# Altium footprint library Amirreza.PcbLib: 524 footprints (part 15 of 33)
Each footprint in its own frame and in the unit in brackets; x right, y up, seen from the top. Pads: shape width x height; smd on the part's side, far side on the other; paste and mask are expansions set on the pad; w line width, h text height; cw(c..) or ccw(c..) is an arc to the next point about the centre after c.
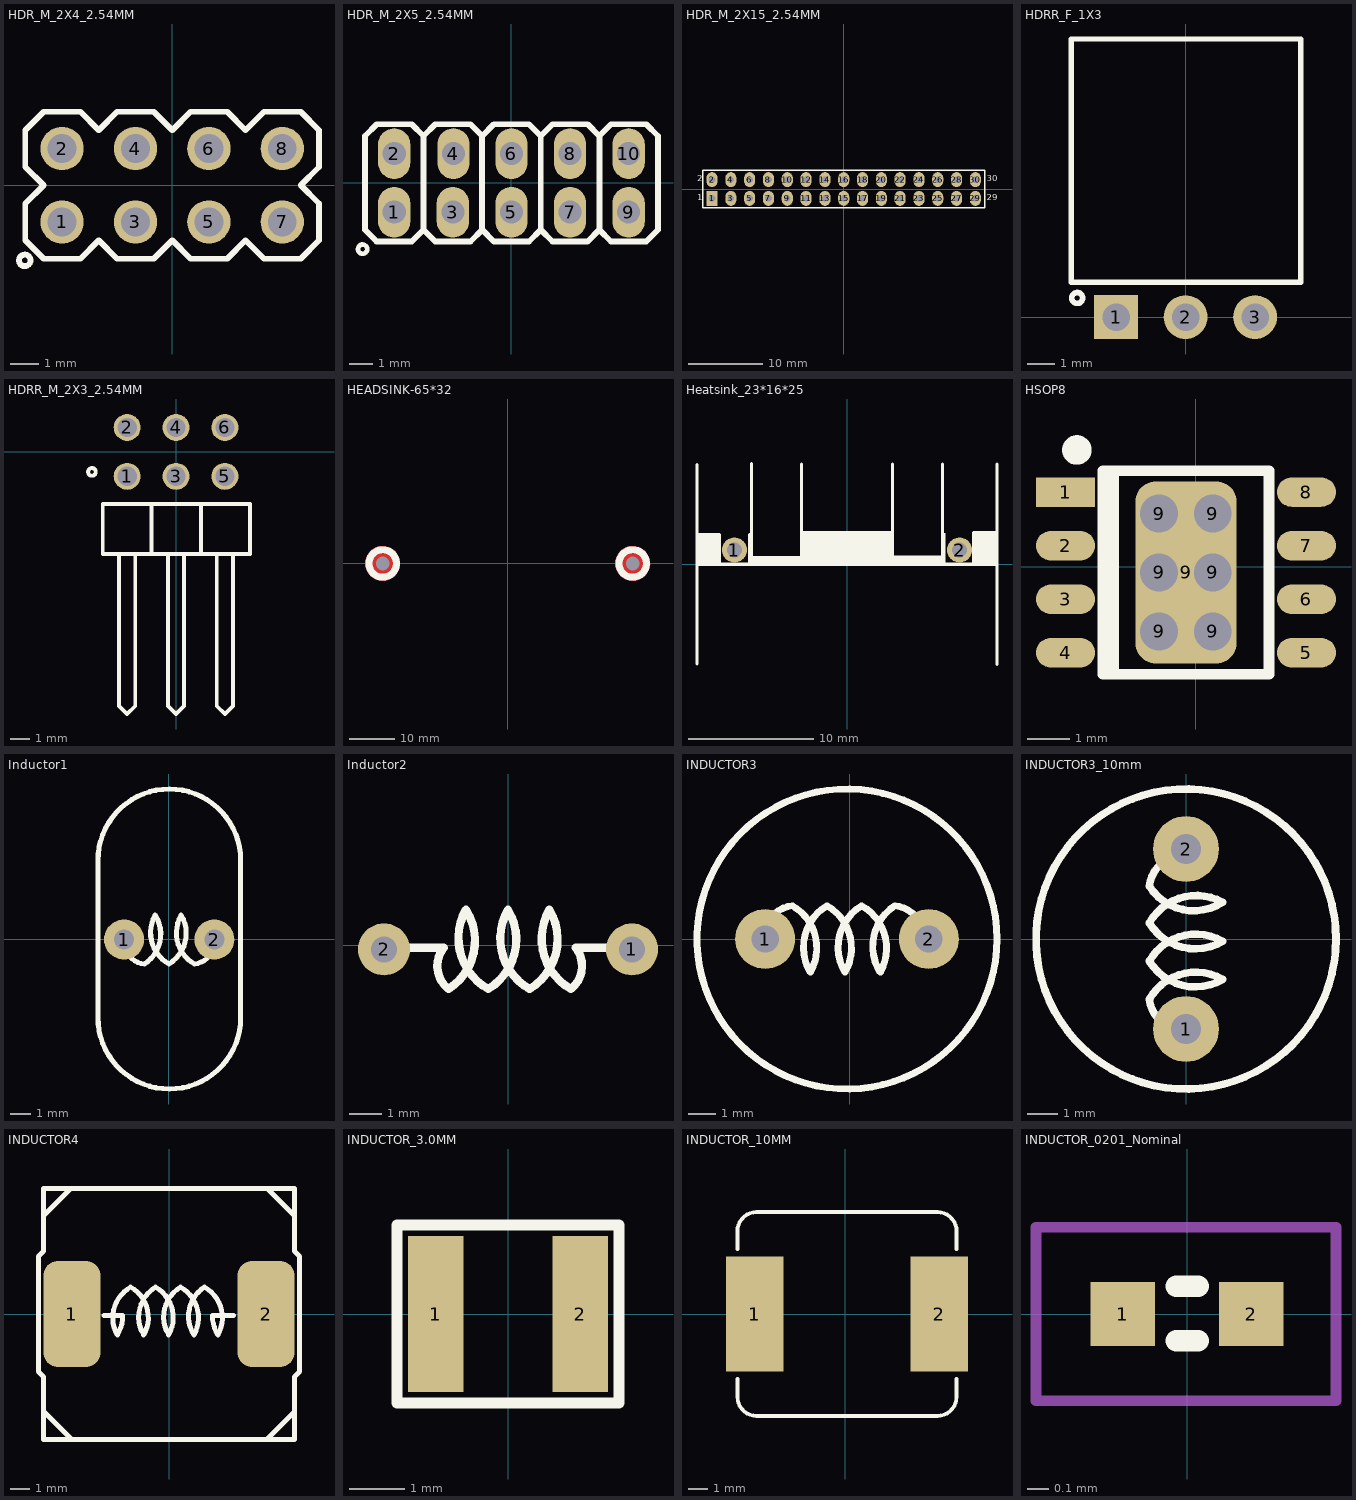
[diagram p14: the footprints below, top view; thin cyan lines are the x and y axes]

## HDR_M_2X4_2.54MM [mm] "Male Header 2X04 with 2.54 mm Pitch"
pads (8):
  round 1.5 / inner round 1.5 / far side round 2 hole 1 mask+0.1: 1(-3.81,-1.27) 2(-3.81,1.27) 3(-1.27,-1.27) 4(-1.27,1.27) 5(1.27,-1.27) 6(1.27,1.27) 7(3.81,-1.27) 8(3.81,1.27)
Top Overlay:
  circle w0.2: c-5.1,-2.6 r0.2
  lines w0.2: -5.08,-1.905 -4.445,-2.54 -3.175,-2.54 -2.54,-1.905 -1.905,-2.54 -0.635,-2.54 0,-1.905 0.635,-2.54 1.905,-2.54 2.54,-1.905 3.175,-2.54 4.445,-2.54 5.08,-1.905 5.08,-0.635 4.445,0 5.08,0.635 5.08,1.905 4.445,2.54 3.175,2.54 2.54,1.905 1.905,2.54 0.635,2.54 0,1.905 -0.635,2.54 -1.905,2.54 -2.54,1.905 -3.175,2.54 -4.445,2.54 -5.08,1.905 -5.08,0.635 -4.445,0 -5.08,-0.635 -5.08,-1.905
3D body "User Library-Header_Male_4Pin.STEP": height 8.54, standoff -3, extent -5.08,-2.49 5.08,0
3D body "User Library-Header_Male_4Pin.STEP": height 8.54, standoff -3, extent -5.08,0 5.08,2.49

## HDR_M_2X5_2.54MM [mm] "Male Header 2X05 with 2.54 mm Pitch"
pads (10):
  oval 1.4x2.2 hole 1: 1(-5.08,-1.27) 2(-5.08,1.27) 3(-2.54,-1.27) 4(-2.515,1.27) 5(0,-1.27) 6(0,1.27) 7(2.54,-1.27) 8(2.54,1.27) 9(5.08,-1.27) 10(5.08,1.27)
Top Overlay:
  circle w0.2: c-6.45,-2.87 r0.2
  lines w0.254: -3.81,-2.032 -3.303,-2.538 -1.778,-2.538 -1.27,-2.03 -1.27,2.034 -0.762,2.542 0.761,2.542 1.27,2.032 ; -3.81,2.032 -4.319,2.542 -5.842,2.542 -6.35,2.034 -6.35,-2.032 -5.843,-2.538 -4.318,-2.538 -3.81,-2.03 -3.81,2.034 -3.302,2.542 -1.779,2.542 -1.27,2.032 ; -1.27,-2.032 -0.763,-2.538 0.762,-2.538 1.27,-2.03 1.27,2.034 1.778,2.542 3.301,2.542 3.81,2.032 ; 1.27,-2.032 1.777,-2.538 3.302,-2.538 3.81,-2.03 3.81,2.034 4.318,2.542 5.841,2.542 6.35,2.032 ; 3.81,-2.032 4.317,-2.538 5.842,-2.538 6.35,-2.03 6.35,2.034
3D body "PIN.STEP": height 8.43, standoff -2.49, extent 3.81,-2.54 6.35,0
3D body "PIN.STEP": height 8.43, standoff -2.49, extent 3.81,0 6.35,2.54
3D body "PIN.STEP": height 8.43, standoff -2.49, extent -6.35,0 -3.81,2.54
3D body "PIN_mid.STEP": height 8.43, standoff -2.49, extent 1.27,-2.54 3.81,0
3D body "PIN_mid.STEP": height 8.43, standoff -2.49, extent -1.27,-2.54 1.27,0
3D body "PIN_mid.STEP": height 8.43, standoff -2.49, extent -3.81,-2.54 -1.27,0
3D body "PIN_mid.STEP": height 8.43, standoff -2.49, extent -3.81,0 -1.27,2.54
3D body "PIN_mid.STEP": height 8.43, standoff -2.49, extent 1.27,0 3.81,2.54
3D body "PIN_mid.STEP": height 8.43, standoff -2.49, extent -1.27,0 1.27,2.54
3D body "PIN.STEP": height 8.43, standoff -2.49, extent -6.35,-2.54 -3.81,0

## HDR_M_2X15_2.54MM [mm] "Connector; Header; 15x2 Position"
pads (30):
  rect 1.5x2 hole 0.9: 1(-17.78,-1.27)
  oval 1.5x2 hole 0.9: 2(-17.78,1.27) 3(-15.24,-1.27) 4(-15.24,1.27) 5(-12.7,-1.27) 6(-12.7,1.27) 7(-10.16,-1.27) 8(-10.16,1.27) 9(-7.62,-1.27) 10(-7.62,1.27) 11(-5.08,-1.27) 12(-5.08,1.27) 13(-2.54,-1.27) 14(-2.54,1.27) 15(0,-1.27) 16(0,1.27) 17(2.54,-1.27) 18(2.54,1.27) 19(5.08,-1.27) 20(5.08,1.27) 21(7.62,-1.27) 22(7.62,1.27) 23(10.16,-1.27) 24(10.16,1.27) 25(12.7,-1.27) 26(12.7,1.27) 27(15.24,-1.27) 28(15.24,1.27) 29(17.78,-1.27) 30(17.78,1.27)
Top Overlay:
  lines w0.2: -19.05,-2.54 -19.05,2.54 19.05,2.54 19.05,-2.54 -19.05,-2.54
  text "30" at 19.304,0.762 h1.4
  text "29" at 19.304,-1.778 h1.4
  text "2" at -19.812,0.762 h1.4
  text "1" at -19.812,-1.778 h1.4
3D body "65827.stp": height 8.57, standoff -2.97, extent -19.075,-2.565 19.025,2.515

## HDRR_F_1X3 [mm] "Connector; Header; 3 Position; Right Angle"
height 12
pads (3):
  rect 1.6x1.6 / inner rect 1.6x1.6 / far side rect 2x2 hole 1: 1(-2.54,0)
  round 1.6 / inner round 1.6 / far side round 2 hole 1: 2(0,0) 3(2.54,0)
Top Overlay:
  circle w0.2: c-3.96,0.7 r0.2
  lines w0.2: -4.17,1.27 -4.17,10.16 4.2,10.16 4.2,1.27 -4.17,1.27
3D body "HDR_F_1X3RA.step": height 2.55, standoff -3.1, extent -4.056,-0.3 4.039,10

## HDRR_M_2X3_2.54MM [mm] "Connector; Header; 3x2 Position"
height 7
pads (6):
  round 1.4 / inner round 1.4 / far side oval 1.4x2.2 hole 1: 1(-2.54,-1.27) 2(-2.54,1.27) 3(0,-1.27) 4(0,1.27) 5(2.54,-1.27) 6(2.54,1.27)
Top Overlay:
  circle w0.2: c-4.37,-1.04 r0.2
  lines w0.2: -2.963,-5.31 -2.963,-13.197 -2.54,-13.62 -2.117,-13.197 -2.117,-5.31 ; -1.24,-5.31 -3.81,-5.31 -3.81,-2.7 -1.24,-2.7 ; -0.423,-5.31 -0.423,-13.197 0,-13.62 0.423,-13.197 0.423,-5.31 ; 1.27,-5.31 3.84,-5.31 3.84,-2.7 1.27,-2.7 ; 2.117,-5.31 2.117,-13.197 2.54,-13.62 2.963,-13.197 2.963,-5.31 ; -1.27,-5.31 -1.27,-2.7 1.3,-2.7 1.3,-5.31 -1.27,-5.31
3D body "2x1 Male Pin Header Angle.STEP": height 5.04, standoff -2.96, extent 1.265,-13.34 3.81,1.56
3D body "2x1 Male Pin Header Angle.STEP": height 5.04, standoff -2.96, extent -1.275,-13.34 1.27,1.56
3D body "2x1 Male Pin Header Angle.STEP": height 5.04, standoff -2.96, extent -3.815,-13.34 -1.27,1.56

## HEADSINK-65*32 [mm]
pads (3):
  round 0 hole 3: 0(-27.497,0) 0(27.497,0) 0(27.497,0)
Top Layer:
  pour cut-out: 25.626,3.315 25.406,3.192 25.003,2.89 24.644,2.537 24.334,2.141 24.078,1.707 23.883,1.243 23.75,0.757 23.682,0.258 23.681,-0.245 23.746,-0.745 23.877,-1.231 24.07,-1.696 24.323,-2.131 24.631,-2.53 24.989,-2.884 25.39,-3.188 25.609,-3.312 25.813,-3.428 26.244,-3.608 26.695,-3.735 27.158,-3.805 27.625,-3.818 28.091,-3.773 28.548,-3.671 28.989,-3.515 29.408,-3.305 29.797,-3.046 30.152,-2.74 30.467,-2.394 30.736,-2.012 30.957,-1.599 31.126,-1.163 31.24,-0.709 31.268,-0.476 31.303,-0.215 31.299,0.313 31.222,0.834 31.074,1.341 30.857,1.821 30.575,2.267 30.235,2.67 29.842,3.022 29.404,3.316 28.93,3.547 28.428,3.71 27.909,3.802 27.382,3.821 26.857,3.767 26.345,3.641 25.855,3.446
  pour cut-out: -29.369,3.315 -29.588,3.192 -29.991,2.89 -30.351,2.538 -30.661,2.141 -30.916,1.707 -31.112,1.243 -31.245,0.757 -31.312,0.258 -31.314,-0.245 -31.248,-0.744 -31.118,-1.231 -30.925,-1.696 -30.672,-2.131 -30.364,-2.529 -30.006,-2.883 -29.604,-3.187 -29.385,-3.311 -29.182,-3.428 -28.75,-3.608 -28.3,-3.734 -27.837,-3.804 -27.369,-3.817 -26.903,-3.773 -26.446,-3.671 -26.005,-3.514 -25.587,-3.305 -25.198,-3.045 -24.843,-2.74 -24.528,-2.394 -24.258,-2.011 -24.037,-1.599 -23.869,-1.162 -23.755,-0.708 -23.726,-0.476 -23.692,-0.215 -23.696,0.313 -23.773,0.835 -23.921,1.341 -24.138,1.822 -24.419,2.268 -24.76,2.671 -25.153,3.023 -25.59,3.317 -26.065,3.548 -26.566,3.71 -27.086,3.802 -27.613,3.822 -28.138,3.768 -28.65,3.642 -29.14,3.446
Bottom Layer:
  pour cut-out: 25.626,3.315 25.406,3.192 25.003,2.89 24.644,2.537 24.334,2.141 24.078,1.707 23.883,1.243 23.75,0.757 23.682,0.258 23.681,-0.245 23.746,-0.745 23.877,-1.231 24.07,-1.696 24.323,-2.131 24.631,-2.53 24.989,-2.884 25.39,-3.188 25.609,-3.312 25.813,-3.428 26.244,-3.608 26.695,-3.735 27.158,-3.805 27.625,-3.818 28.091,-3.773 28.548,-3.671 28.989,-3.515 29.408,-3.305 29.797,-3.046 30.152,-2.74 30.467,-2.394 30.736,-2.012 30.957,-1.599 31.126,-1.163 31.24,-0.709 31.268,-0.476 31.303,-0.215 31.299,0.313 31.222,0.834 31.074,1.341 30.857,1.821 30.575,2.267 30.235,2.67 29.842,3.022 29.404,3.316 28.93,3.547 28.428,3.71 27.909,3.802 27.382,3.821 26.857,3.767 26.345,3.641 25.855,3.446
  pour cut-out: -29.369,3.315 -29.588,3.192 -29.991,2.89 -30.351,2.538 -30.661,2.141 -30.916,1.707 -31.112,1.243 -31.245,0.757 -31.312,0.258 -31.314,-0.245 -31.248,-0.744 -31.118,-1.231 -30.925,-1.696 -30.672,-2.131 -30.364,-2.529 -30.006,-2.883 -29.604,-3.187 -29.385,-3.311 -29.182,-3.428 -28.75,-3.608 -28.3,-3.734 -27.837,-3.804 -27.369,-3.817 -26.903,-3.773 -26.446,-3.671 -26.005,-3.514 -25.587,-3.305 -25.198,-3.045 -24.843,-2.74 -24.528,-2.394 -24.258,-2.011 -24.037,-1.599 -23.869,-1.162 -23.755,-0.708 -23.726,-0.476 -23.692,-0.215 -23.696,0.313 -23.773,0.835 -23.921,1.341 -24.138,1.822 -24.419,2.268 -24.76,2.671 -25.153,3.023 -25.59,3.317 -26.065,3.548 -26.566,3.71 -27.086,3.802 -27.613,3.822 -28.138,3.768 -28.65,3.642 -29.14,3.446
Top Overlay:
  circle w1.524: c27.497,0 r3.022
  circle w1.524: c-27.497,0 r3.022
Bottom Overlay:
  lines w0.152: -32.929,-15.85 33.06,-15.85 33.06,15.621 -32.929,15.621 -32.929,-15.85
3D body "User Library-Heatsink 6_3x22 mm.step": height -0.64, standoff -5.44, extent 11.071,-15.858 33.071,-9.562
3D body "User Library-Heatsink 6_3x22 mm.step": height -0.64, standoff -5.44, extent 11.071,-9.562 33.071,-3.266
3D body "User Library-Heatsink 6_3x22 mm.step": height -0.64, standoff -5.44, extent 11.071,-3.266 33.071,3.029
3D body "User Library-Heatsink 6_3x22 mm.step": height -0.64, standoff -5.44, extent 11.071,3.029 33.071,9.325
3D body "User Library-Heatsink 6_3x22 mm.step": height -0.64, standoff -5.44, extent 11.071,9.325 33.071,15.621
3D body "User Library-Heatsink 6_3x22 mm.step": height -0.64, standoff -5.44, extent -10.929,-15.858 11.071,-9.562
3D body "User Library-Heatsink 6_3x22 mm.step": height -0.64, standoff -5.44, extent -10.929,-9.562 11.071,-3.266
3D body "User Library-Heatsink 6_3x22 mm.step": height -0.64, standoff -5.44, extent -10.929,-3.266 11.071,3.029
3D body "User Library-Heatsink 6_3x22 mm.step": height -0.64, standoff -5.44, extent -10.929,3.029 11.071,9.325
3D body "User Library-Heatsink 6_3x22 mm.step": height -0.64, standoff -5.44, extent -10.929,9.325 11.071,15.621
3D body "User Library-Heatsink 6_3x22 mm.step": height -0.64, standoff -5.44, extent -32.929,-15.858 -10.929,-9.562
3D body "User Library-Heatsink 6_3x22 mm.step": height -0.64, standoff -5.44, extent -32.929,-9.562 -10.929,-3.266
3D body "User Library-Heatsink 6_3x22 mm.step": height -0.64, standoff -5.44, extent -32.929,-3.266 -10.929,3.029
3D body "User Library-Heatsink 6_3x22 mm.step": height -0.64, standoff -5.44, extent -32.929,3.029 -10.929,9.325
3D body "User Library-Heatsink 6_3x22 mm.step": height -0.64, standoff -5.44, extent -32.929,9.325 -10.929,15.621
3D body "CRAFTECH-MHN1903-148-108.STEP": height 2.16, standoff -3.9, extent -30.973,-3.353 -24.115,3.505
3D body "CRAFTECH-MHN1903-148-108.STEP": height 2.16, standoff -3.9, extent 24.021,-3.353 30.879,3.505

## Heatsink_23*16*25 [mm]
pads (2):
  round 2 hole 1.2: 1(-9,1.143) 2(9,1.143)
Top Overlay:
  rectangle: -3.632,0.076 3.632,2.54
  rectangle: -11.938,0.051 -10.135,2.413
  rectangle: -7.772,0.025 -7.645,2.362
  rectangle: 7.722,0 7.874,2.515
  rectangle: 10.135,0 11.989,2.515
  rectangle: -7.696,0 -3.454,0.66
  rectangle: 3.632,0.076 7.874,0.686
  lines w0.254: -11.989,-7.976 -11.989,0 ; -11.989,2.362 -10.211,2.362 -10.211,0 -7.772,0 -7.772,2.362 -7.645,2.362 ; -11.989,7.976 -11.989,0 ; -7.645,0.025 -7.645,2.362 ; -7.645,8.001 -7.645,8.052 -7.645,2.362 ; -3.632,0.076 -3.632,8.001 ; -3.632,2.54 3.632,2.54 ; 3.632,0.076 3.632,8.001 ; 7.645,0.152 7.645,8.001 ; 10.109,0.127 10.109,2.515 10.135,2.54 11.963,2.54 ; 11.989,-8.001 11.989,0 ; 11.989,8.001 11.989,0 ; -11.989,0 11.989,0

## HSOP8 [mm]
pads (15):
  rect 1.4x0.7 smd: 1(-3.092,1.77)
  oval 1.4x0.7 smd: 2(-3.092,0.5) 3(-3.092,-0.77) 4(-3.092,-2.04) 5(2.625,-2.04) 6(2.625,-0.77) 7(2.625,0.5) 8(2.625,1.77)
  oval 1.1x1.5 hole 0.9: 9(-0.869,-1.532) 9(-0.869,-0.135) 9(-0.869,1.262) 9(0.401,-1.532) 9(0.401,-0.135) 9(0.401,1.262)
  rrect40% 2.4x4.32 smd: 9(-0.233,-0.135)
Top Overlay:
  circle w0.5: c-2.819,2.769 r0.1
  lines w0.254: -1.949,-2.548 -1.949,2.278 ; -2.203,-2.548 -2.203,2.278 1.734,2.278 1.734,-2.548 -2.203,-2.548
3D body "CircuitWorks-SO-8.STEP": height 1.45, standoff 0, extent -3.111,-2.578 2.667,2.324

## Inductor1 [mm]
pads (2):
  round 2 hole 1: 1(-2.235,-0.025) 2(2.265,-0.025)
Top Overlay:
  lines w0.254: -3.548,-3.937 -3.548,4.125 ; -3.54,-3.925 ccw(c0.02,-3.925) 3.58,-3.925 ; -3.54,3.925 cw(c0.02,3.925) 3.58,3.925 ; -2.235,-0.025 ccw(c-1.118,-0.127) -1.219,-1.245 ccw(c-2.172,0.241) -0.686,1.194 ccw(c0.876,0.318) 0,-1.245 ccw(c-0.914,0.279) 0.61,1.194 ccw(c2.159,0.305) 1.27,-1.245 ccw(c1.158,-0.138) 2.265,-0.025 ; 3.573,-3.937 3.573,3.962

## Inductor2 [mm]
pads (2):
  round 1.6 hole 0.8: 1(3.81,-0.127) 2(-3.81,-0.127)
Top Overlay:
  lines w0.254: -3.759,-0.076 -1.978,-0.076 ccw(c-1.268,-0.636) -1.827,-1.346 ccw(c-2.78,0.14) -1.294,1.092 ccw(c0.268,0.216) -0.608,-1.346 ccw(c-1.523,0.178) 0.001,1.092 ccw(c1.551,0.203) 0.662,-1.346 ccw(c-0.253,0.178) 1.271,1.092 ccw(c2.821,0.203) 1.932,-1.346 ccw(c1.372,-0.636) 2.083,-0.076 3.759,-0.076

## INDUCTOR3 [mm]
pads (2):
  round 2.2 hole 1: 1(-3.099,0) 2(2.901,0)
Top Overlay:
  circle w0.254: c-0.099,0 r5.5
  lines w0.254: -3.099,0 cw(c-1.992,0.112) -2.104,1.219 cw(c-2.993,-0.33) -1.444,-1.219 cw(c0.08,-0.305) -0.834,1.219 cw(c-1.723,-0.33) -0.174,-1.219 cw(c1.35,-0.305) 0.436,1.219 cw(c-0.44,-0.343) 1.122,-1.219 cw(c2.608,-0.267) 1.655,1.219 cw(c1.554,0.102) 2.671,0

## INDUCTOR3_10mm [mm]
pads (2):
  round 2.2 hole 1: 1(0,-3) 2(0,3)
Top Overlay:
  circle w0.254: c0,0 r5
  lines w0.254: 0,-3 cw(c-0.112,-1.893) -1.219,-2.005 cw(c0.33,-2.894) 1.219,-1.345 cw(c0.305,0.179) -1.219,-0.735 cw(c0.33,-1.624) 1.219,-0.075 cw(c0.305,1.449) -1.219,0.535 cw(c0.343,-0.341) 1.219,1.221 cw(c0.267,2.707) -1.219,1.754 cw(c-0.102,1.652) 0,2.77
3D body "User Library-bobina_470uH2.step": height 10.5, standoff -3, extent -4,-3.975 4,4.025

## INDUCTOR4 [mm]
pads (2):
  rrect50% 2.9x5.4 smd: 1(-4.95,0) 2(4.95,0)
Top Overlay:
  lines w0.254: -6.4,5.004 -5.004,6.4 ; -6.349,-5.004 -4.953,-6.4 ; -3.327,-0.076 -2.358,-0.076 cw(c-4.123,-0.089) -2.637,-1.041 ; -2.637,-1.067 cw(c-1.075,-0.191) -1.952,1.372 cw(c-2.841,-0.178) -1.291,-1.067 cw(c0.233,-0.152) -0.682,1.372 cw(c-1.571,-0.178) -0.021,-1.067 cw(c1.503,-0.152) 0.588,1.372 cw(c-0.288,-0.19) 1.274,-1.067 cw(c2.76,-0.114) 1.808,1.372 cw(c0.931,-0.19) 2.493,-1.067 ; 2.493,-1.041 cw(c3.979,-0.089) 2.214,-0.076 3.301,-0.076 ; 4.978,-6.4 6.375,-5.004 ; 5.004,6.4 6.4,5.004 ; -6.655,-2.945 -6.655,2.945 -6.4,3.2 -6.4,6.4 6.4,6.4 6.4,3.2 6.655,2.945 6.655,-2.945 6.4,-3.2 6.4,-6.4 -6.4,-6.4 -6.4,-3.2 -6.655,-2.945
3D body "User Library-SRR1210_inductor.STEP": height 10.42, standoff 0.06, extent -5.975,-6.006 6.025,5.994

## INDUCTOR_3.0MM [mm] "INDUCTOR, 3.5X3.0X2.0MM"
pads (2):
  rect 1x2.8 smd paste-0.1 mask+0.1: 1(-1.3,0) 2(1.3,0)
Top Overlay:
  lines w0.2: -2,-1.6 2,-1.6 2,1.6 -2,1.6 -2,-1.6
3D body "Inductor_CD32.STEP": height 2.45, standoff -0.02, extent -1.704,-1.644 1.704,1.644

## INDUCTOR_10MM [mm] "INDUCTOR, 10.5X11.5mm, CDRH104R, MSS1038 (coilcraft)"
height 4
pads (2):
  rect 3x6 smd paste-4: 1(-4.72,0.003) 2(4.88,0.003)
Top Overlay:
  lines w0.2: -5.62,-3.378 -5.62,-4.297 ccw(c-4.62,-4.297) -4.62,-5.297 4.78,-5.297 ccw(c4.78,-4.297) 5.78,-4.297 5.78,-3.378 ; -5.62,3.384 -5.62,4.484 ; -5.62,4.303 cw(c-4.62,4.303) -4.62,5.303 4.78,5.303 cw(c4.78,4.303) 5.78,4.303 ; 5.78,3.384 5.78,4.484
Top Paste:
  region: 5.98,2.703 3.78,2.703 3.78,0.203 5.98,0.203
  region: 5.98,-0.197 3.78,-0.197 3.78,-2.697 5.98,-2.697
  rectangle: -5.82,-2.697 -3.62,-0.197
  rectangle: -5.82,0.203 -3.62,2.703
3D body "MPC1040LR45C.step": height 4.01, standoff 0, extent -5.67,-5.147 5.83,5.153

## INDUCTOR_0201_Nominal [mm] "CHIP Resistor, 0.5x0.25mm, 0201, soldered"
pads (2):
  rect 0.3x0.3 smd mask+0.05: 1(-0.3,0) 2(0.3,0)
Top Overlay:
  lines w0.102: -0.051,-0.124 0.051,-0.124 ; -0.051,0.13 0.051,0.13
Mechanical 13:
  lines w0.05: -0.704,-0.404 -0.704,0.404 0.694,0.404 0.694,-0.404 -0.704,-0.404
3D body: height 0.2, standoff 0, extent 0.15,-0.125 0.25,0.125
3D body: height 0.2, standoff 0, extent -0.25,-0.125 -0.15,0.125
3D body: height 0.2, standoff 0, extent -0.15,-0.125 0.15,0.125